# Altium footprint library zynq.PcbLib: 111 footprints (part 7 of 7)
Each footprint in its own frame and in the unit in brackets; x right, y up, seen from the top. Pads: shape width x height; smd on the part's side, far side on the other; paste and mask are expansions set on the pad; w line width, h text height; cw(c..) or ccw(c..) is an arc to the next point about the centre after c.
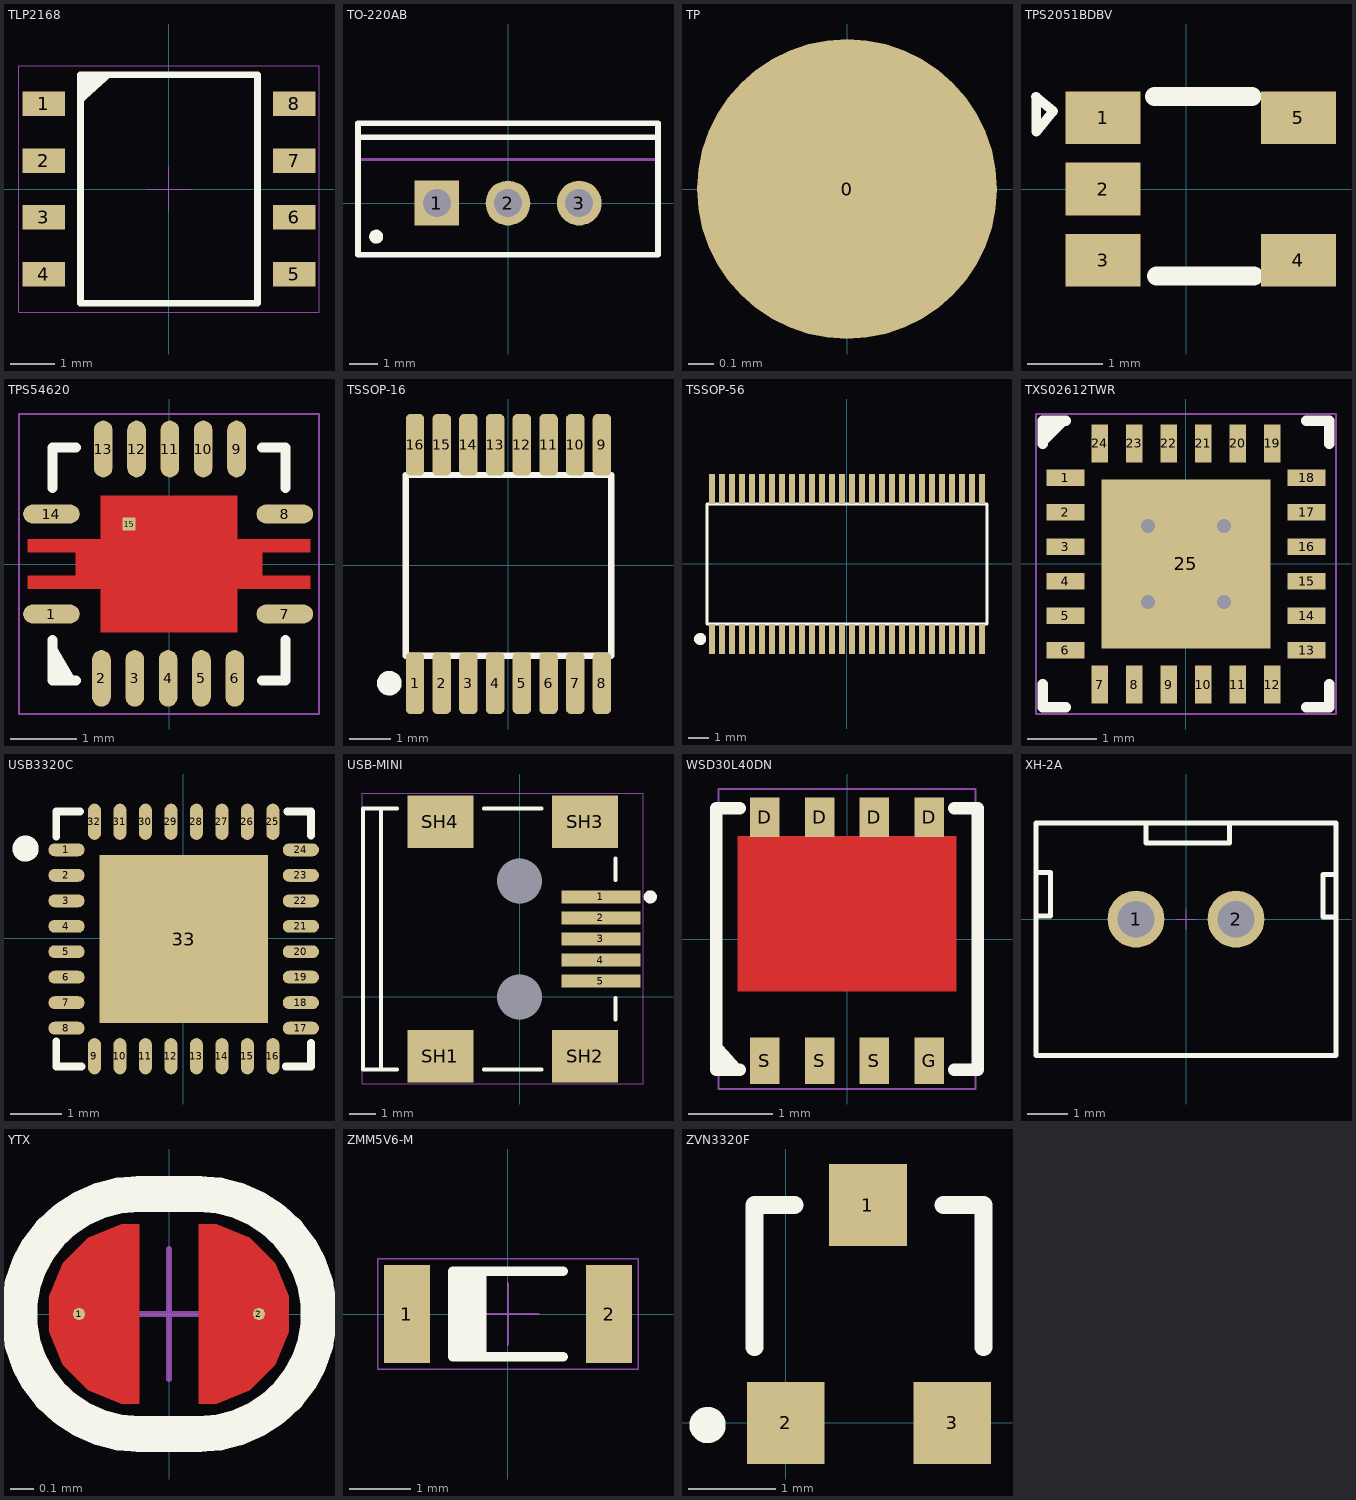
[diagram p6: the footprints below, top view; thin cyan lines are the x and y axes]

## TLP2168 [mm]
pads (8):
  rect 0.95x0.55 smd: 1(-2.8,1.905) 2(-2.8,0.635) 3(-2.8,-0.635) 4(-2.8,-1.905) 5(2.8,-1.905) 6(2.8,-0.635) 7(2.8,0.635) 8(2.8,1.905)
Top Overlay:
  region: -1.27,2.54 -1.975,1.905 -1.975,2.55
  lines w0.152: -1.975,-2.55 1.975,-2.55 1.975,2.55 -1.975,2.55 -1.975,-2.55
Mechanical 15:
  lines w0.025: -0.5,0 0.5,0 ; 0,-0.5 0,0.5 ; -3.35,-2.75 3.35,-2.75 3.35,2.75 -3.35,2.75 -3.35,-2.75

## TO-220AB [mm] "TO, Thru-Hole, Vertical, Heatsink Mounted; 3 In-Line Leads; Pitch 2.54 mm"
height 19.3
pads (3):
  rect 1.6x1.6 hole 1: 1(-2.54,0)
  round 1.6 hole 1: 2(0,0) 3(2.54,0)
Top Overlay:
  circle w0.25: c-4.7,-1.2 r0.125
  lines w0.2: -5.35,2.35 5.35,2.35 ; -5.35,-1.85 5.35,-1.85 5.35,2.85 -5.35,2.85 -5.35,-1.85
Mechanical 13:
  lines w0.1: -5.35,1.55 5.35,1.55 ; -5.35,-1.85 -5.35,2.85 5.35,2.85 5.35,-1.85 -5.35,-1.85
Mechanical 15:
  lines w0.1: -0.5,0 0.5,0 ; 0,-0.5 0,0.5
3D body: height 19.3, standoff 12.9, extent -5.349,1.551 5.349,2.849
3D body: height 12.9, standoff 4, extent -5.4,-1.9 5.4,2.9

## TP [mm]
pads (1):
  round 1.2 smd: 0(0,0)

## TPS2051BDBV [mm] "TPS2051BDBV"
pads (5):
  rect 1x0.7 smd: 1(-1.104,0.95) 2(-1.104,0) 3(-1.104,-0.95) 4(1.496,-0.95) 5(1.496,0.95)
Top Overlay:
  lines w0.127: -1.996,1.228 -1.768,1.037 -1.993,0.759 -1.993,1.229
  lines w0.254: -0.418,1.229 0.877,1.229 ; -0.393,-1.158 0.903,-1.158

## TPS54620 [mm] "VQFN_3_5"
pads (15):
  oval 0.85x0.28 smd paste-0.04: 1(-1.763,-0.75) 7(1.737,-0.75) 8(1.737,0.75) 14(-1.763,0.75)
  oval 0.28x0.85 smd paste-0.04: 2(-1.013,-1.716) 3(-0.513,-1.716) 4(-0.013,-1.716) 5(0.487,-1.716) 6(0.987,-1.716) 9(1.013,1.725) 10(0.513,1.725) 11(0.013,1.725) 12(-0.487,1.725) 13(-0.987,1.725)
  rect 0.2x0.2 smd paste+0: 15(-0.6,0.6)
Top Layer:
  region: -1.35,-0.175 -2.124,-0.175 -2.124,-0.375 -1.35,-0.375
  region: -1.35,0.375 -2.124,0.375 -2.124,0.175 -1.35,0.175
  region: -1.013,0.375 -1.4,0.375 -1.4,-0.375 -1.013,-0.375
  rectangle: 1.35,0.175 2.125,0.375
  rectangle: 1.35,-0.375 2.125,-0.175
  rectangle: 1.013,-0.375 1.4,0.375
  rectangle: -1.025,-1.025 1.025,1.025
Top Overlay:
  region: -1.753,-1.139 -1.394,-1.75 -1.75,-1.75
  lines w0.152: -1.75,-1.143 -1.75,-1.75 -1.397,-1.75 ; -1.75,1.143 -1.75,1.75 -1.397,1.75 ; 1.397,-1.75 1.75,-1.75 1.75,-1.143 ; 1.397,1.75 1.75,1.75 1.75,1.143
Top Paste:
  rectangle: -1.025,0.15 -0.15,1.027
  region: 0.15,1.025 0.15,0.15 1.027,0.15 1.027,1.025
  region: 1.025,-0.15 0.15,-0.15 0.15,-1.027 1.025,-1.027
  region: -0.15,-1.025 -0.15,-0.15 -1.027,-0.15 -1.027,-1.025
Mechanical 15:
  lines w0.025: -0.254,0 0.254,0 ; 0,-0.254 0,0.254 ; -2.25,-2.25 2.25,-2.25 2.25,2.25 -2.25,2.25 -2.25,-2.25
3D body "tps54620.STEP": height 0.82, standoff 0, extent -1.77,-1.77 1.77,1.77

## TSSOP-16 [mm]
pads (16):
  rrect50% 0.45x1.5 smd: 1(-2.275,-2.866) 2(-1.625,-2.866) 3(-0.975,-2.866) 4(-0.325,-2.866) 5(0.325,-2.866) 6(0.975,-2.866) 7(1.625,-2.866) 8(2.275,-2.866) 9(2.275,2.934) 10(1.625,2.934) 11(0.975,2.934) 12(0.325,2.934) 13(-0.325,2.934) 14(-0.975,2.934) 15(-1.625,2.934) 16(-2.275,2.934)
Top Overlay:
  circle w0.3: c-2.899,-2.866 r0.15
  lines w0.152: -2.5,-2.2 2.5,-2.2 2.5,2.2 -2.5,2.2 -2.5,-2.2

## TSSOP-56 [mm]
pads (56):
  rect 0.3x1.5 smd: 1(-6.75,-3.75) 2(-6.25,-3.75) 3(-5.75,-3.75) 4(-5.25,-3.75) 5(-4.75,-3.75) 6(-4.25,-3.75) 7(-3.75,-3.75) 8(-3.25,-3.75) 9(-2.75,-3.75) 10(-2.25,-3.75) 11(-1.75,-3.75) 12(-1.25,-3.75) 13(-0.75,-3.75) 14(-0.25,-3.75) 15(0.25,-3.75) 16(0.75,-3.75) 17(1.25,-3.75) 18(1.75,-3.75) 19(2.25,-3.75) 20(2.75,-3.75) 21(3.25,-3.75) 22(3.75,-3.75) 23(4.25,-3.75) 24(4.75,-3.75) 25(5.25,-3.75) 26(5.75,-3.75) 27(6.25,-3.75) 28(6.75,-3.75) 29(6.75,3.75) 30(6.25,3.75) 31(5.75,3.75) 32(5.25,3.75) 33(4.75,3.75) 34(4.25,3.75) 35(3.75,3.75) 36(3.25,3.75) 37(2.75,3.75) 38(2.25,3.75) 39(1.75,3.75) 40(1.25,3.75) 41(0.75,3.75) 42(0.25,3.75) 43(-0.25,3.75) 44(-0.75,3.75) 45(-1.25,3.75) 46(-1.75,3.75) 47(-2.25,3.75) 48(-2.75,3.75) 49(-3.25,3.75) 50(-3.75,3.75) 51(-4.25,3.75) 52(-4.75,3.75) 53(-5.25,3.75) 54(-5.75,3.75) 55(-6.25,3.75) 56(-6.75,3.75)
Top Overlay:
  circle w0.3: c-7.342,-3.75 r0.15
  lines w0.152: -7,-3 7,-3 7,3 -7,3 -7,-3

## TXS02612TWR [mm] "PQFN, 24-Leads, Body 4.00x4.00mm, Pitch 0.50mm, Thermal Pad 2.45x2.45mm, IPC High Density"
height 0.8
pads (25):
  rect 0.55x0.24 smd: 1(-1.75,1.25) 2(-1.75,0.75) 3(-1.75,0.25) 4(-1.75,-0.25) 5(-1.75,-0.75) 6(-1.75,-1.25) 13(1.75,-1.25) 14(1.75,-0.75) 15(1.75,-0.25) 16(1.75,0.25) 17(1.75,0.75) 18(1.75,1.25)
  rect 0.24x0.55 smd: 7(-1.25,-1.75) 8(-0.75,-1.75) 9(-0.25,-1.75) 10(0.25,-1.75) 11(0.75,-1.75) 12(1.25,-1.75) 19(1.25,1.75) 20(0.75,1.75) 21(0.25,1.75) 22(-0.25,1.75) 23(-0.75,1.75) 24(-1.25,1.75)
  rect 2.45x2.45 smd: 25(0,0)
via -0.55,0.55 diameter 0.45 hole 0.2
via 0.55,0.55 diameter 0.45 hole 0.2
via -0.55,-0.55 diameter 0.45 hole 0.2
via 0.55,-0.55 diameter 0.45 hole 0.2
Top Overlay:
  region: -1.679,2.075 -2.075,2.075 -2.075,1.679
  lines w0.152: -2.075,-1.746 -2.075,-2.075 -1.746,-2.075 ; -2.075,1.746 -2.075,2.075 -1.746,2.075 ; 1.746,-2.075 2.075,-2.075 2.075,-1.746 ; 1.746,2.075 2.075,2.075 2.075,1.746
Mechanical 15:
  lines w0.025: -0.5,0 0.5,0 ; 0,-0.5 0,0.5 ; -2.175,-2.175 -2.175,2.175 2.175,2.175 2.175,-2.175 -2.175,-2.175
3D body "txs02612rtw.STEP": height 0.81, standoff 0, extent -2.01,-2.007 2.01,2.013

## USB3320C [mil] "USB3320C"
pads (33):
  oval 28x10 smd: 1(-90.16,68.38) 2(-90.16,48.69) 3(-90.16,29.01) 4(-90.16,9.32) 5(-90.16,-10.36) 6(-90.16,-30.05) 7(-90.16,-49.73) 8(-90.16,-69.42) 17(90.94,-69.42) 18(90.94,-49.73) 19(90.94,-30.05) 20(90.94,-10.36) 21(90.94,9.32) 22(90.94,29.01) 23(90.94,48.69) 24(90.94,68.38)
  oval 10x28 smd: 9(-68.51,-91.07) 10(-48.82,-91.07) 11(-29.14,-91.07) 12(-9.45,-91.07) 13(10.23,-91.07) 14(29.92,-91.07) 15(49.6,-91.07) 16(69.29,-91.07) 25(69.29,90.03) 26(49.6,90.03) 27(29.92,90.03) 28(10.23,90.03) 29(-9.45,90.03) 30(-29.14,90.03) 31(-48.82,90.03) 32(-68.51,90.03)
  rect 129.93x129.93 smd: 33(0.39,-0.52)
Top Overlay:
  circle w10: c-121.74,69.33 r5.1
  lines w6: -98.04,-79.81 -98.04,-98.95 -78.54,-98.95 ; -98.04,78.68 -98.04,97.91 -79.64,97.91 ; 79.22,-98.95 98.82,-98.95 98.82,-80.91 ; 80.32,97.91 98.82,97.91 98.82,79.42

## USB-MINI [mm]
pads (11):
  rect 3x0.5 smd: 1(3.093,3.8) 2(3.093,3) 3(3.093,2.2) 4(3.093,1.4) 5(3.093,0.6)
  rect 2.5x2 smd: SH1(-3.007,-2.25) SH2(2.493,-2.25) SH3(2.493,6.65) SH4(-3.007,6.65)
  round 0 hole 1.7 unplated: ""(0,0) ""(0,4.4)
Top Overlay:
  circle w0.25: c4.968,3.8 r0.125
  lines w0.152: -5.257,-2.75 -5.257,7.15 ; -4.657,-2.75 -5.957,-2.75 -5.957,7.15 -4.657,7.15 ; -1.358,-2.75 0.843,-2.75 ; -1.358,7.15 0.843,7.15 ; 3.642,-0.85 3.642,-0.05 ; 3.642,4.45 3.642,5.25
Mechanical 15:
  lines w0.025: -5.969,-3.302 -5.969,7.747 4.699,7.747 4.699,-3.302 -5.969,-3.302
3D body "usb-mini.STEP": height 4, standoff -0.85, extent -5.842,-2.75 3.358,7.15

## WSD30L40DN [mm]
pads (8):
  rect 0.35x0.47 smd: D(-0.975,1.445) D(-0.325,1.445) D(0.325,1.445) D(0.975,1.445)
  rect 0.35x0.55 smd: G(0.975,-1.445) S(-0.975,-1.445) S(-0.325,-1.445) S(0.325,-1.445)
Top Layer:
  rectangle: -1.3,-0.62 1.3,1.22
Top Overlay:
  region: -1.215,-1.55 -1.524,-1.55 -1.524,-1.206
  lines w0.152: -1.274,-1.55 -1.55,-1.55 -1.55,1.55 -1.274,1.55 ; 1.274,-1.55 1.55,-1.55 1.55,1.55 1.274,1.55
Mechanical 15:
  lines w0.025: -0.254,0 0.254,0 ; 0,-0.254 0,0.254 ; -1.524,-1.778 -1.524,1.778 1.524,1.778 1.524,-1.778 -1.524,-1.778

## XH-2A [mil] "XH2.54接线端子2P"
pads (2):
  round 56 hole 36: 1(-49.22,0) 2(49.22,0)
Top Overlay:
  lines w5: -147.22,3 -133.22,3 -133.22,46 -146.22,46 ; -39.22,93 -39.22,75 42.78,75 42.78,94 ; 145.78,2 134.78,2 134.78,44 146.78,44 ; -147.65,-134.17 -147.65,94.49 147.63,94.49 147.63,-134.17 -147.65,-134.17
Mechanical 15:
  lines w1: -10,0 10,0 ; 0,-10 0,10 ; -147.31,-133.09 -147.31,95 147.31,95 147.31,-133.09 -147.31,-133.09
3D body "sh2.5-2pin.STEP": height 275.59, standoff -133.86, extent -145.67,-134.17 145.67,94.17

## YTX [mil]
pads (2):
  round 2 smd: 1(-15,0) 2(15,0)
Top Layer:
  region: -5,-15 -7.98,-15 -13.5,-12.72 -17.72,-8.5 -20,-2.98 -20,2.98 -17.72,8.5 -13.5,12.72 -7.98,15 -5,15
  region: 5,-15 7.98,-15 13.5,-12.72 17.72,-8.5 20,-2.98 20,2.98 17.72,8.5 13.5,12.72 7.98,15 5,15
Top Overlay:
  lines w6: -5,-20 cw(c-5,0) -5,20 5,20 cw(c5,0) 5,-20 -5,-20
Top Solder:
  rectangle: -5.92,-19.01 6.2,19.01
Mechanical 15:
  lines w1: -10.83,0 10.83,0 ; 0,-10.83 0,10.83 ; -5,-20 cw(c-5,0) -5,20 5,20 cw(c5,0) 5,-20 -5,-20

## ZMM5V6-M [mm] "MELF Diode, 2-Leads, Body 3.50x1.45mm, IPC High Density"
height 1.5
pads (2):
  rect 0.75x1.6 smd: 1(-1.65,0) 2(1.65,0)
Top Overlay:
  rectangle: -0.9,-0.7 -0.35,0.7
  lines w0.152: 0.9,-0.7 -0.9,-0.7 -0.9,0.7 0.9,0.7
Mechanical 15:
  lines w0.025: -0.5,0 0.5,0 ; 0,-0.5 0,0.5 ; -2.125,-0.9 2.125,-0.9 2.125,0.9 -2.125,0.9 -2.125,-0.9

## ZVN3320F [mil] "MOSFET-N"
pads (3):
  rect 35x37 smd: 1(37,98) 2(0,0) 3(75,0)
Top Overlay:
  circle w10: c-35.16,-1 r3.16
  lines w8: -14,34 -14,98 4,98 ; 71,98 89,98 89,34